# Altium schematic symbol library LimeMicroAltiumLib.SchLib: 584 symbols (part 10 of 13)
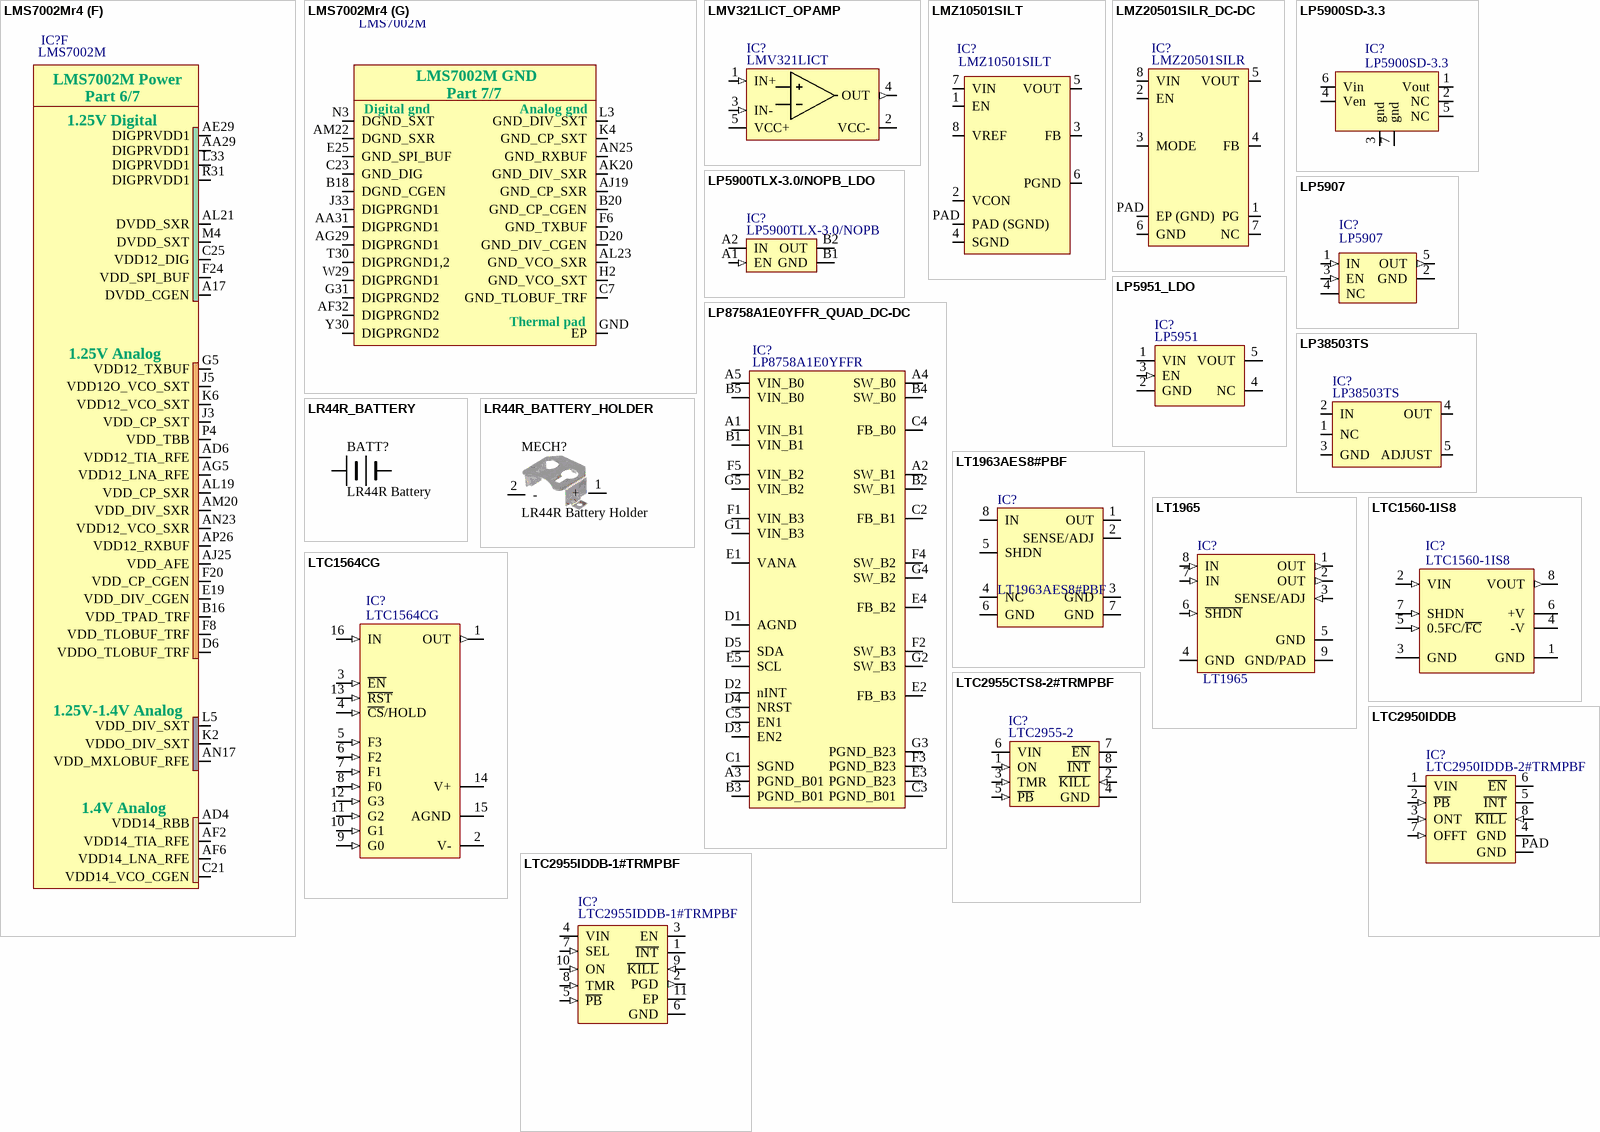
[diagram p83: symbols LMS7002Mr4 to LTC2955IDDB-1#TRMPBF]

## LTC2955IDDB-1#TRMPBF
designator IC?
Pushbutton On / Off Controller with Automatic Turn-On, 10-pin SON (DDB10), -40 to 85 degC, Pb-Free, Mini Tape and Reel; Part Description: IC CTLR ON/OFF PUSHBUTTON 10-DFN; Manufacturer: Analog Devices / Linear Technology; Min Supply Voltage: 1.6V; Max Supply Voltage: 36V; Operating Supply Current: 1.2uA; Threshold Voltage: 800mV; ComponentLink3Description: Package Specification; ComponentLink3URL: http://cds.linear.com/docs/en/packaging/DFN_10_05-08-1722.pdf; ComponentLink2URL: http://cds.linear.com/docs/en/datasheet/2955f.pdf; ComponentLink2Description: Datasheet; ComponentLink1Description: Manufacturer URL; ComponentLink1URL: http://www.linear.com/; Supplier 1: Digi-Key; Supplier Part Number 1: LTC2955IDDB-1#TRMPBFCT-ND; Manufacturer Part Number 1: LTC2955IDDB-1#TRMPBF; Stock 1: 8955; Pricing 1: 1=6,06000, 25=3,44000, 100=3,07230 (USD); RoHS: Yes; Case/Package: DFN; Number of Pins: 10; Min Operating Temperature: -40°C; Max Operating Temperature: 85°C; Package Quantity: 500; Packaging: Tape and Reel; Nominal Supply Current: 1.2uA; Length: 3mm; REACH SVHC: No SVHC; Lead Free: Lead Free; ComponentLink4URL: https://datasheet.ciiva.com/1169/1563221-1169346.pdf?src-supplier=Element14; ComponentLink4Description: https://datasheet.ciiva.com/1169/1563221-1169346.pdf?src-supplier=Element14; ComponentLink5URL: https://datasheet.ciiva.com/1176/1563221-1176339.pdf?src-supplier=Newark; ComponentLink5Description: https://datasheet.ciiva.com/1176/1563221-1176339.pdf?src-supplier=Newark; ComponentLink6URL: https://datasheet.ciiva.com/22621/1563221-22621578.pdf?src-supplier=Element14; ComponentLink6Description: https://datasheet.ciiva.com/22621/1563221-22621578.pdf?src-supplier=Element14; ComponentLink7URL: https://datasheet.ciiva.com/1967/41161-1967533.pdf?src-supplier=Digi-Key; ComponentLink7Description: https://datasheet.ciiva.com/1967/41161-1967533.pdf?src-supplier=Digi-Key; ComponentLink8URL: https://datasheet.ciiva.com/1173/1563221-1173151.pdf?src-supplier=Farnell; ComponentLink8Description: https://datasheet.ciiva.com/1173/1563221-1173151.pdf?src-supplier=Farnell; ComponentLink9URL: https://datasheet.ciiva.com/1967/41161-1967535.pdf?src-supplier=Digi-Key; ComponentLink9Description: https://datasheet.ciiva.com/1967/41161-1967535.pdf?src-supplier=Digi-Key; ComponentLink10URL: https://datasheet.ciiva.com/48695/001256199-da-01-en-ic-ctlr-ltc2955iddb-1-trmpbf-dfn-10-ltc-48695846.pdf?src-supplier=Conrad; ComponentLink10Description: https://datasheet.ciiva.com/48695/001256199-da-01-en-ic-ctlr-ltc2955iddb-1-trmpbf-dfn-10-ltc-48695846.pdf?src-supplier=Conrad
footprint LTC2955IDDB-1#TRMPBF_10-DFN (SON, 10-Leads, Body 3x2mm, Pitch 0.5mm, Thermal Pad 2.39x0.64mm)
pins: 1 ~{INT} (oc) "Open Drain Interrupt Output. Connect this pin to the interrupt input of the system with a pull-up resistor to the system supply. The LTC2955 asserts the I\N\T\ pin low when it receives the turn-off command from the (See Datasheet)", 2 PGD (out) "ON Status Output. A high on this pin indicates that the voltage at the ON pin is above the input threshold of 0.8V. This pin can be used as a system input to inform the system whether the turn-on was triggered by the ON pin (See Datasheet)", 3 EN (oc) "Enable Output (LTC2955-1). EN is an active high output to control the turn-on/off of the system power. Connect this pin to the RUN or S\H\U\T\D\O\W\N\ pin of the voltage regulator. The LTC2955 asserts EN high when the (See Datasheet)", 4 VIN (power) "Power Supply Input. For > 20V applications, connect VIN to the power source through a 1k resistor and bypass VIN to GND with a 10nF low ESR capacitor.", 5 ~{PB} (in) "Pushbutton Input. This is an active low input with a 900k pull-up to an internal LDO. Connect one terminal of the pushbutton to this pin and connect the other terminal of the pushbutton to GND. The pin may be left open if (See Datasheet)", 6 GND (power) "Device Ground.", 7 SEL (in) "Mode Select Input. Connect SEL to GND to block the ON pin falling edge from activating system turn-off. Connect SEL to VIN to allow both the ON pin rising and falling edges to activate system turn-on and turn-off (See Datasheet)", 8 TMR (in) "Timer Pin. A capacitor to ground determines the additional time (5.2 seconds/uF) beyond the default 64ms that the pushbutton must be held low before immediately releasing the EN/E\N\ and I\N\T\ outputs. The turn-off debounce (See Datasheet)", 9 ~{KILL} (in) "Kill Input. A low at K\I\L\L\ releases the enable output (EN/E\N\). This pin can be driven by the microprocessor or it can be used as a voltage monitor input. Tie to the system power supply or an external voltage of 1.2V~5V (See Datasheet)", 10 ON (in) "Monitor Input. Connect this pin to an external resistive divider from the monitored voltage. This allows automatic system turn-on when the monitored voltage transitions high. For the DFN part, if the SEL pin is tied high, it (See Datasheet)", 11 EP (power) "Exposed pad. Leave open or connect to device ground."

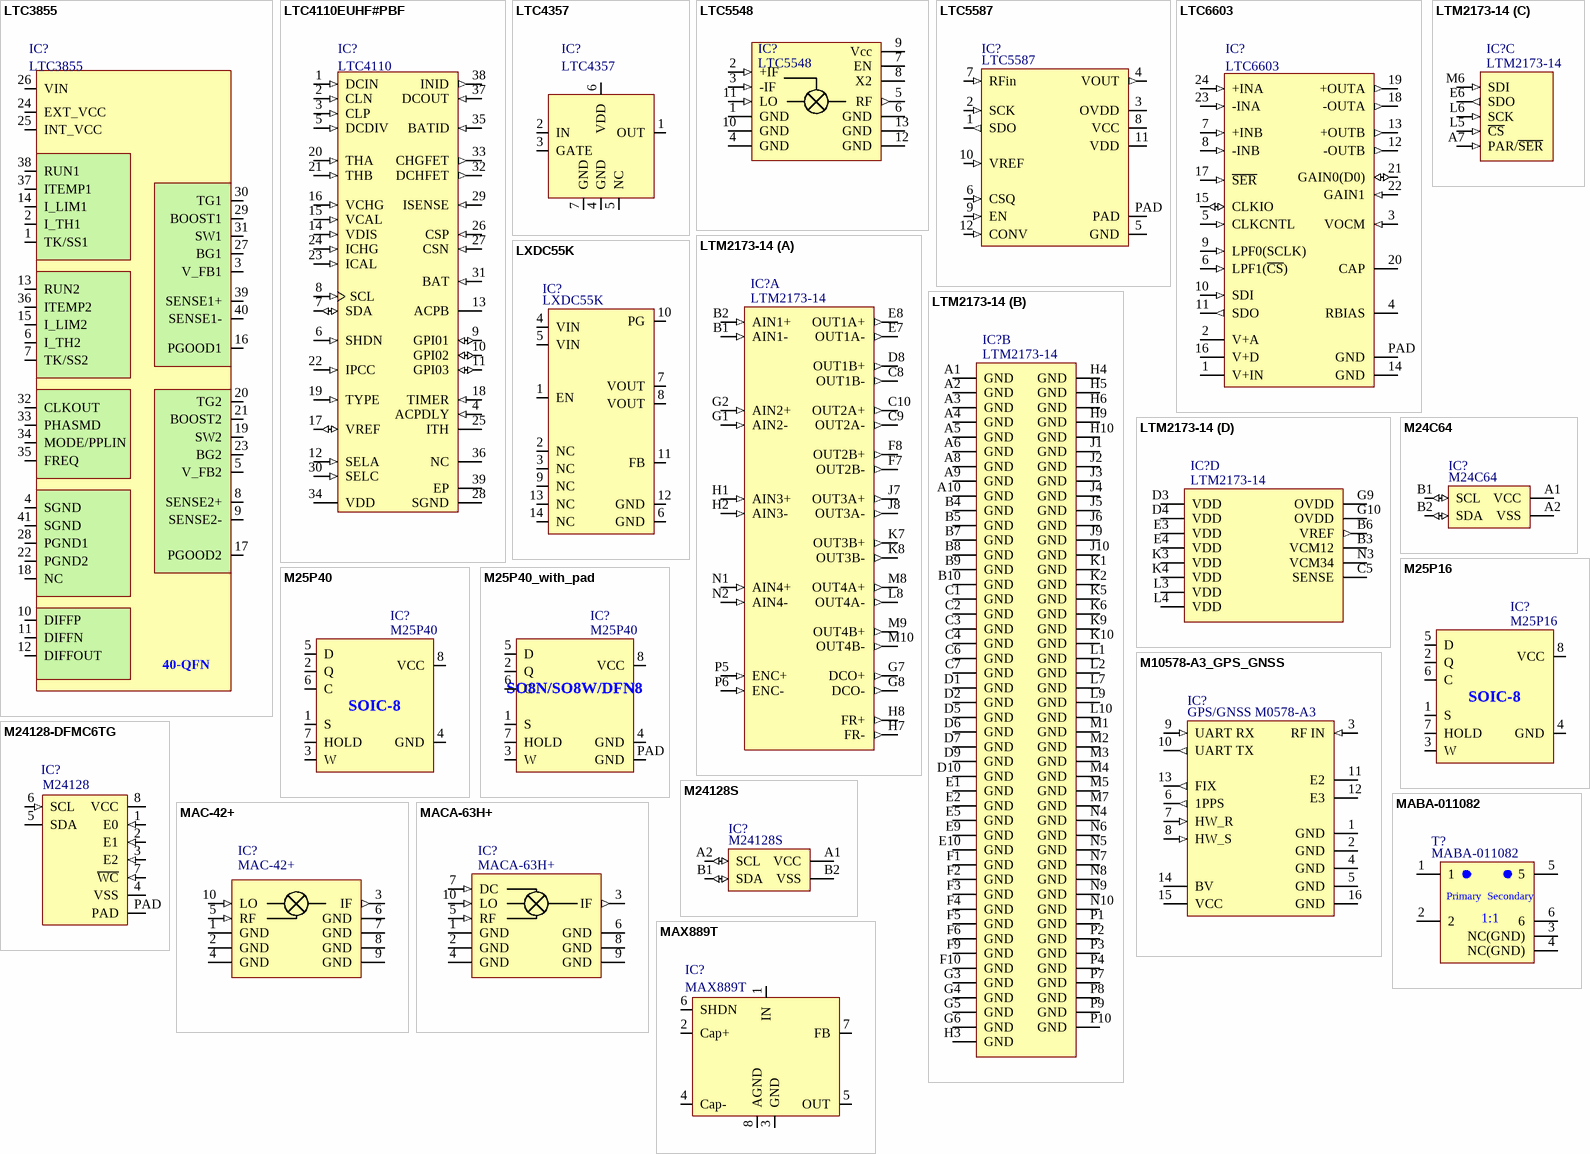
[diagram p57: symbols LTC3855 to MAX889T]

## LTC3855
designator IC?
Manufacturer: Linear Technology; Number of Outputs: 2; Frequency - Max: 850kHz; Voltage - Supply: 4.5 V ~ 38 V; Duty Cycle: 95%; Supplier 1: Digi-Key; Package / Case: 40-WFQFN Exposed Pad; Operating Temperature: -40°C ~ 85°C; Category: Integrated Circuits (ICs); Supplier Part Number 1: LTC3855EUJ#TRPBF-ND
footprint LTC3855 (QFN, 40-Leads, Body 6,00x6,00mm, Pitch 0,50mm, Thermal Pad 4,40x4,40mm, IPC Medium Density)
pins: 1 TK/SS1, 2 I_TH1, 3 V_FB1, 4 SGND, 5 V_FB2, 6 I_TH2, 7 TK/SS2, 8 SENSE2+, 9 SENSE2-, 10 DIFFP, 11 DIFFN, 12 DIFFOUT, 13 RUN2, 14 I_LIM1, 15 I_LIM2, 16 PGOOD1, 17 PGOOD2, 18 NC, 19 SW2, 20 TG2, 21 BOOST2, 22 PGND2, 23 BG2, 24 EXT_VCC, 25 INT_VCC, 26 VIN, 27 BG1, 28 PGND1, 29 BOOST1, 30 TG1, 31 SW1, 32 CLKOUT, 33 PHASMD, 34 MODE/PPLIN, 35 FREQ, 36 ITEMP2, 37 ITEMP1, 38 RUN1, 39 SENSE1+, 40 SENSE1-, 41 SGND
text: 40-QFN

## LTC4110EUHF#PBF
designator IC?, comment LTC4110
Battery Backup System Manager, 4.5 to 19 V Vin, 38-pin QFN (UHF-38), -40 to 85 degC, Pb-Free; Part Description: Battery Multi-Function Controller IC Multi-Chemistry 38-QFN (5x7); Manufacturer Part Number 1: LTC4110EUHF#PBF; Manufacturer: Linear Technology/Analog Devices; Supplier 1: Digi-Key; Supplier Part Number 1: LTC4110EUHF#PBF-ND
footprint LTC4110EUHF#PBF_QFN38 (QFN, 38-Leads, Body 7.1x5.1mm, Pitch 0.5mm, Thermal Pad 3.15x5.15mm, IPC Low Density)
pins: 1 DCIN (in) "External DC Power Sense Input. Provides a control input and supply for the main supply ideal diode function.", 2 CLN (in) "Current Limit Sense Negative Input. See CLP pin.", 3 CLP (in) "Current Limit Sense Positive Input. This pin and the CLN pin form a differential input that senses voltage on an external resistor for reverse current entering the power source while in low loss calibration mode. Should the (See Datasheet)", 4 ACPDLY (in) "ACPb Delay Control Pin. A capacitor connected from ACPDLY to GND and a resistor from VREF to GND programs delay in the ACPb pin high-to-low transition. Open if minimum delay is desired.", 5 DCDIV (in) "AC Present Detection Input. Backup operation is invoked when the system power voltage, divided by an external resistor divider, falls below the threshold of this pin.", 6 SHDN (in) "Active High Shutdown/Reset Control Logic Input. Forces micropower shutdown mode if high when DCIN supply is removed. Forces all registers to reset if high when DCIN supply is present. Normally tied to ground. Internal pin (See Datasheet)", 7 SDA (io) "SMBus Bidirectional Data Signal. Connect to VDD when not in use.", 8 SCL (in) "SMBus Clock Signal Input From SMBus Host. Connect to VDD when not in use.", 9 GPI01 (io) "General Purpose I/O or Charge Status Pin. A logic-level I/O bit port that is configurable as a host-driven input/output port or as a battery charge status output (CHGb) with an open-drain N-MOSFET that is asserted low when (See Datasheet)", 10 GPI02 (io) "General Purpose I/O Pin. A logic-level I/O bit port that is configurable as a host-driven input/output port or as a battery undervoltage status output (BKUP_FLTb) with an open-drain N-MOSFET that is asserted low only while (See Datasheet)", 11 GPI03 (io) "General Purpose I/O Pin. A logic-level I/O bit port that is configurable as a host-driven input/output port or as a calibration complete status output (CAL_COMPLETEb) with an open-drain N-MOSFET that is asserted low when (See Datasheet)", 12 SELA (in) "SMBus Address Selection Input. Selects the LTC4110 SMBus address to facilitate redundant backup systems when standard batteries are used. Connect to GND for 12h, VDD for 28h and the VREF pin for 20h. When a smart battery is (See Datasheet)", 13 ACPB (oc) "AC Present Status Digital Output. Open-Drain N-MOSFET output is asserted low when the main supply is present as detected by the DCDIV pin and internal DCIN UVLO.", 14 VDIS (in) "Battery Discharge Voltage Limit During Backup Program Input. Battery threshold voltage at which backup mode will terminate by turning off the isolation P-MOSFET with the BATID pin. Adjustable from external resistor string (See Datasheet)", 15 VCAL (in) "Battery Voltage Limit During Calibration Program Input. Battery threshold voltage at which calibration will terminate. Adjustable from external resistor string biased from VREF pin. For default threshold connect to GND pin.", 16 VCHG (in) "Battery Float Voltage Program Input. Trims the float voltage during charging. Programmed from external resistor string biased from VREF pin. Connect to GND for default float voltage.", 17 VREF (io) "Voltage Reference Output and Timing Programming Input. Provides a typical virtual reference of 1.220V (VREF) for an external resistor divider tied between this pin and GND that programs the VCHG, VCAL and VDIS pin functions. (See Datasheet)", 18 TIMER (in) "Charge Timing Input. A capacitor connected between TIMER and GND along with the resistance connected from VREF to GND programs the charge time intervals.", 19 TYPE (in) "Refer to Table 8.", 20 THA (in) "Safety Signal Force/Sense Pin to Smart Battery and Force Pin to Lead Acid Battery Thermistor. See description of operation for more detail. The maximum allowed combined capacitance on THA, THB and Safety Signal is 1nF. For (See Datasheet)", 21 THB (in) "Safety Signal Force/Sense Pin to Smart Battery and Sense Pin to Lead Acid Battery Thermistor. See description of operation for more detail. The maximum allowed combined capacitance on THA, THB and Safety Signal is 1nF.", 22 IPCC (in) "Battery Preconditioning Charge Current Program Input. Programs the battery current during preconditioning or wakeup charging. Programmed from external resistor to GND.", 23 ICAL (in) "Battery Discharge Current During Calibration Program Input. Programs the constant discharge current at the battery during calibration. Programmed from external resistor to GND.", 24 ICHG (in) "Battery Current During Charge Program Input. Programs the battery current while constant-current bulk charging. Programmed from external resistor to GND.", 25 ITH "Control Signal of the Current Mode PWM. AC compensates control loop. Higher ITH voltage corresponds to higher charging current.", 26 CSP (in) "Current Sense Positive Input. This pin and the CSN pin measure voltage across the external current sense resistor to control battery current during charging and calibration.", 27 CSN (in) "Current Sense Negative Input. This pin and the CSP pin measure voltage across the external current sense resistor to control battery current during charging and calibration.", 28 SGND (power) "Signal Ground Reference Input. This pin should be Kelvin connected to the flyback current sense resistor and to the battery return.", 29 ISENSE (in) "Current Sense Input. Senses current in the flyback transformer by monitoring voltage across the external current sense resistor. This pin should be Kelvinconnected to the resistor.", 30 SELC (in) "Refer to Table 8.", 31 BAT (in) "Battery Voltage Sense Input. This pin is used to monitor the battery and control charging voltage through an internal resistor divider connected to this pin that is disconnected in shutdown mode. Also provides a control (See Datasheet)", 32 DCHFET (out) "Drives the Gate of an External N-MOSFET. Used to drive energy into the battery side of the high efficiency switch mode converter during low loss calibration discharge of the battery. Provides synchronous rectification during (See Datasheet)", 33 CHGFET (out) "Drives the Gate of an External N-MOSFET. Used to drive energy into the supply side of the high efficiency switch mode converter during battery charging. Provides synchronous rectification during low loss calibration mode.", 34 VDD (power) "Bypass Capacitor Connection for Internal VDD Regulator. Bypass at pin with 100nF low ESR capacitor to GND.", 35 BATID (in) "Drives the Gate of the Battery P-MOSFET Ideal Diode. Controls low loss ideal diode between the battery and backup load when in backup mode. When not in backup mode, the P-MOSFET is turned off to prevent battery power from (See Datasheet)", 36 NC "No Connect.", 37 DCOUT (in) "System Power Output Voltage Monitor Input. Provides a control input for supply input ideal diode and battery ideal diode functions. Also supplies power to the IC. Bypass at pin with 100nF low ESR capacitor to GND.", 38 INID (out) "Drives the Gate of the Supply Input P-MOSFET Ideal Diode. Controls low loss ideal diode between the supply input and backup load when not in backup mode.", 39 EP (power) "Ground. The Exposed Pad must be soldered to the PCB."

## LTC4357
designator IC?
Manufacturer Part Number: LTC4357IDCB#TRMPBF; Current - Supply: 500µA; Delay Time - OFF: 300ns; Voltage - Supply: 9 V ~ 80 V; FET Type: N-Channel; Supplier 1: Digi-Key; Type: N+1 ORing Controller; Category: Integrated Circuits (ICs); Applications: Automotive, Redundant Power Supplies, Telecom Infrastructure; Operating Temperature: -40°C ~ 85°C; Supplier Device Package: 6-DFN (2x3); Supplier Part Number: LTC4357IDCB#TRMPBFDKR-ND
footprint LTC4357 (SON, 6-Leads, Body 2,00x3,00mm, Pitch 0,50mm, Thermal Pad 1,35x1,12mm, IPC Medium Density)
pins: 1 OUT, 2 IN, 3 GATE, 4 GND, 5 NC, 6 VDD, 7 GND

## LTC5548
designator IC?
Frequency Mixer 2 GHz to 12 GHz; Manufacturer: Analog Devices / Linear Technology; Manufacturer Part Number: LTC5548IUDB#TRMPBF; Frequency: 14GHz; Noise Figure: 9.6dB; Operating Supply Current: 136mA; Min Supply Voltage: 3V; Max Supply Voltage: 3.6V; Supplier 1: Digi-Key; Stock 1: 1418; Pricing 1: 1=19.06, 25=15.2464, 100=12.425, 250=12.14472 (USD); Case/Package: QFN; Number of Pins: 12; Min Operating Temperature: -40°C; Max Operating Temperature: 105°C; Packaging: Tape and Reel; Max Frequency: 14GHz; REACH SVHC: No SVHC; Supplier Part Number 1: LTC5548IUDB#TRMPBFCT-ND
footprint LTC5548_FROM_ULTRA_LABRARIAN
pins: 1 GND, 2 +IF (in), 3 -IF (in), 4 GND, 5 RF (out), 6 GND, 7 EN, 8 X2, 9 Vcc, 10 GND, 11 LO (in), 12 GND, 13 GND

## LTC5587
designator IC?
Manufacturer: Linear Technology/Analog Devices; Manufacturer Part Number: LTC5587IDD#TRPBF; Part Description: RF Detector IC CDMA, GSM, EDGE, W-CDMA 10MHz ~ 6GHz -34dBm ~ 6dBm ±1dB 12-WFDFN Exposed Pad; Frequency: 10MHz ~ 6GHz; RF Type: CDMA, GSM, EDGE, W-CDMA; Input Range: -34dBm ~ 6dBm; Accuracy: ±1dB; Voltage - Supply: 2.7 V ~ 3.6 V; Supplier 1: Digi-Key; RoHS: RoHS Compliant; Category: RF/IF and RFID; Stock 1: 0; Pricing 1: 2500=6.49745 (USD); Packaging: Tape & Reel (TR); Part Status: Active; Package / Case: 12-WFDFN Exposed Pad; Supplier Device Package: 12-DFN (3x3); ComponentLink1URL: http://www.linear.com/docs/29700; ComponentLink1Description: http://www.linear.com/docs/29700; Supplier Part Number 1: LTC5587IDD#TRPBFTR-ND
footprint LTC5587_DFN12
pins: 1 SDO (out), 2 SCK (in), 3 OVDD (power), 4 VOUT (out), 5 GND, 6 CSQ (in), 7 RFin (in), 8 VCC (power), 9 EN (in), 10 VREF (in), 11 VDD (power), 12 CONV (in), PAD

## LTC6603
designator IC?
Part Description: Low Pass Filter IC Low Pass 9th Order 2.5MHz 24-QFN (4x4); Manufacturer: Analog Devices / Linear Technology; Manufacturer Part Number 1: LTC6603IUF#PBF; Nominal Gain Bandwidth Product: 2.5MHz; Max Supply Voltage: 3.6V; Min Supply Voltage: 2.7V; Operating Supply Voltage: 3V; Number of Circuits: 2; Input Offset Voltage (Vos): 8mV; Supplier 1: Mouser; Supplier Part Number 1: 584-LTC6603IUF#PBF; Stock 1: 219; Pricing 1: 1=16,66000, 25=13,32000, 100=10,86000, 250=10,61000, 500=10,20000 (USD); RoHS: Yes; Case/Package: QFN; Number of Pins: 24; Min Operating Temperature: -40°C; Max Operating Temperature: 85°C; Package Quantity: 91; Type: Active; Packaging: Rail/Tube; Number of Channels: 2; Radiation Hardening: No; Lead Free: Lead Free; ComponentLink1URL: https://datasheet.ciiva.com/1779/26885-1779299.pdf?src-supplier=Digi-Key; ComponentLink1Description: https://datasheet.ciiva.com/1779/26885-1779299.pdf?src-supplier=Digi-Key; ComponentLink2URL: https://datasheet.ciiva.com/1150/1712310-1150994.pdf?src-supplier=Element14; ComponentLink2Description: https://datasheet.ciiva.com/1150/1712310-1150994.pdf?src-supplier=Element14; ComponentLink3URL: https://datasheet.ciiva.com/1153/1712310-1153853.pdf?src-supplier=Farnell; ComponentLink3Description: https://datasheet.ciiva.com/1153/1712310-1153853.pdf?src-supplier=Farnell
footprint LTC6603_QFN24
pins: 1 V+IN (power) "Input Voltage Supply (2.7V =< V =< 5.5V). This supply must be kept free from noise and ripple. It should be bypassed directly to a ground plane with a 0.1uF capacitor unless it is tied to V+A (Pin 2). The bypass should be as (See Datasheet)", 2 V+A (power) "Analog Voltage Supply (2.7V =< V =< 3.6V). This supply must be kept free from noise and ripple. It should be bypassed directly to a ground plane with a 0.1uF capacitor. The bypass should be as close as possible to the IC.", 3 VOCM (in) "Output common mode voltage reference. If floated, an internal resistive divider sets the voltage on this pin to half the supply voltage (typically 1.5V), maximizing the dynamic range of the filter. If this pin is floated, it (See Datasheet)", 4 RBIAS "Oscillator Frequency-Setting Resistor Input. The value of the resistor connected between this pin and ground determines the frequency of the master oscillator, and sets the bias currents for the fi lter networks. The voltage (See Datasheet)", 5 CLKCNTL (in) "Clock Control Input. This three-state input selects the function of CLKIO (Pin 15). Tying the CLKCNTL pin to ground allows the CLKIO pin to be driven by an external clock (CLKIO is the master clock input).", 6 LPF1(~{CS}) (in) "TTL Level Input. When in pin programmable control mode, this pin is the MSB of the lowpass cutoff frequency control code; in serial control mode, this pin is the chip select input (active low).", 7 +INB (in) "Channel B Differential Inputs. The input range and input resistance are described in the Applications Information section. Input voltages which exceed V+IN (Pin 1) should be avoided.", 8 -INB (in) "Channel B Differential Inputs. The input range and input resistance are described in the Applications Information section. Input voltages which exceed V+IN (Pin 1) should be avoided.", 9 LPF0(SCLK) (in) "TTL Level Input. When in pin programmable control mode, this pin is the LSB of the lowpass cutoff frequency control code; in serial control mode, this pin is the clock of the serial interface.", 10 SDI (in) "TTL Level Input. When in pin programmable control mode, this pin is left floating; in serial control mode, this pin is the serial data input.", 11 SDO (out) "TTL Level Input. When in pin programmable control mode, this pin is left floating; in serial control mode, this pin is the serial data output.", 12 -OUTB (out) "Channel B differential filter outputs. These pins can drive 1k and/or 50pF loads. For larger capacitive loads, an external 100ohm series resistor is recommended for each output. The common mode voltage of the filter outputs (See Datasheet)", 13 +OUTB (out) "Channel B differential filter outputs. These pins can drive 1k and/or 50pF loads. For larger capacitive loads, an external 100ohm series resistor is recommended for each output. The common mode voltage of the filter outputs (See Datasheet)", 14 GND (power) "Ground. Connect to a ground plane for best performance.", 15 CLKIO (io) "When CLKCNTL (Pin 5) is tied to ground, CLKIO is the master clock input. When CLKCNTL is floated, CLKIO is pulled to ground by a weak pulldown. When CLKCNTL is tied to V+D (Pin 16), CLKIO is the master clock output. When (See Datasheet)", 16 V+D (power) "Digital Voltage Supply (2.7V =< V =< 3.6V). This supply must be kept free from noise and ripple. It should be bypassed directly to a ground plane with a 0.1uF capacitor. The bypass should be as close as possible to the IC.", 17 ~{SER} (in) "Interface Selection Input. When tied to V+D (Pin 16) or floated, the interface is in pin programmable control mode, i.e. the filter gain and cutoff frequencies are programmed by the GAIN1, GAIN0, LPF1 and LPF0 pins. When (See Datasheet)", 18 -OUTA (out) "Channel A differential filter outputs. These pins can drive 1k and/or 50pF loads. For larger capacitive loads, an external 100ohm series resistor is recommended for each output. The common mode voltage of the filter outputs (See Datasheet)", 19 +OUTA (out) "Channel A differential filter outputs. These pins can drive 1k and/or 50pF loads. For larger capacitive loads, an external 100ohm series resistor is recommended for each output. The common mode voltage of the filter outputs (See Datasheet)", 20 CAP "Connect a 0.1uF bypass capacitor to this pin. Pin 20 is a buffered version of Pin 3.", 21 GAIN0(D0) (io) "TTL Level Input. When in pin programmable control mode, this pin is the LSB of the gain control code; in serial control mode, this pin is the LSB of the serial control register, an output.", 22 GAIN1 (in) "TTL Level Input. When in pin programmable control mode, this pin is the MSB of the gain control code; in serial control mode, this pin is a no-connect.", 23 -INA (in) "Channel A Differential Inputs. The input range and input resistance are described in the Applications Information section. Input voltages which exceed V+IN (Pin 1) should be avoided.", 24 +INA (in) "Channel A Differential Inputs. The input range and input resistance are described in the Applications Information section. Input voltages which exceed V+IN (Pin 1) should be avoided.", PAD GND (power) "Ground. The Exposed Pad must be soldered to PCB."

## LTM2173-14
designator IC?
Analog to Digital Converters - ADC 14-bit, 80Msps, 1.8V Low Noise Quad ADC, Serial LVDS Outputs; Manufacturer: Analog Devices; Manufacturer Part Number 1: LTC2271IUKG#PBF; Supplier Part Number 1: 584-LTC2271IUKG#PBF; Part Description: Analog to Digital Converters - ADC 14-bit, 80Msps, 1.8V Low Noise Quad ADC, Serial LVDS Outputs; Supplier 1: Mouser
footprint LTM2173_14_BGA9x11.25_140
part A pins: B1 AIN1- (in), B2 AIN1+ (in), C8 OUT1B- (out), C9 OUT2A- (out), C10 OUT2A+ (out), D8 OUT1B+ (out), E7 OUT1A- (out), E8 OUT1A+ (out), F7 OUT2B- (out), F8 OUT2B+ (out), G1 AIN2- (in), G2 AIN2+ (in), G7 DCO+ (out), G8 DCO- (out), H1 AIN3+ (in), H2 AIN3- (in), H7 FR- (out), H8 FR+ (out), J7 OUT3A+ (out), J8 OUT3A- (out), K7 OUT3B+ (out), K8 OUT3B- (out), L8 OUT4A- (out), M8 OUT4A+ (out), M9 OUT4B+ (out), M10 OUT4B- (out), N1 AIN4+ (in), N2 AIN4- (in), P5 ENC+ (in), P6 ENC- (in)
part B pins: A1 GND, A2 GND, A3 GND, A4 GND, A5 GND, A6 GND, A8 GND, A9 GND, A10 GND, B4 GND, B5 GND, B7 GND, B8 GND, B9 GND, B10 GND, C1 GND, C2 GND, C3 GND, C4 GND, C6 GND, C7 GND, D1 GND, D2 GND, D5 GND, D6 GND, D7 GND, D9 GND, D10 GND, E1 GND, E2 GND, E5 GND, E9 GND, E10 GND, F1 GND, F2 GND, F3 GND, F4 GND, F5 GND, F6 GND, F9 GND, F10 GND, G3 GND, G4 GND, G5 GND, G6 GND, H3 GND, H4 GND, H5 GND, H6 GND, H9 GND, H10 GND, J1 GND, J2 GND, J3 GND, J4 GND, J5 GND, J6 GND, J9 GND, J10 GND, K1 GND, K2 GND, K5 GND, K6 GND, K9 GND, K10 GND, L1 GND, L2 GND, L7 GND, L9 GND, L10 GND, M1 GND, M2 GND, M3 GND, M4 GND, M5 GND, M7 GND, N4 GND, N5 GND, N6 GND, N7 GND, N8 GND, N9 GND, N10 GND, P1 GND, P2 GND, P3 GND, P4 GND, P7 GND, P8 GND, P9 GND, P10 GND
part C pins: A7 PAR/~{SER} (in), E6 SDO (out), L5 ~{CS} (in), L6 SCK (in), M6 SDI (in)
part D pins: B3 VCM12 (power), B6 VREF (out), C5 SENSE (power), D3 VDD (power), D4 VDD (power), E3 VDD (power), E4 VDD (power), G9 OVDD (power), G10 OVDD (power), K3 VDD (power), K4 VDD (power), L3 VDD (power), L4 VDD (power), N3 VCM34 (power)

## LXDC55K
designator IC?
LXDC55KAAA-205; Manufacturer: Murata Electronics North America; Power (Watts) - Manufacture Series: 11W; Current - Output (Max): 3A; Efficiency: 93%; Voltage - Input (Min): 2.7V; Voltage - Input (Max): 5.5V; Voltage - Output 1: 0.8 ~ 3.6 V; Number of Outputs: 1; Supplier 1: Digi-Key; Manufacturer Part Number 1: LXDC55KAAA-205; Category: Power Supplies - Board Mount; Type: Non-Isolated PoL Module; Package / Case: 14-SMD Module; Voltage - Output 3: -; Mounting Type: Surface Mount; Applications: ITE (Commercial); RoHS: RoHS Compliant; Power (Watts) - Max: 11W; Voltage - Output 2: -; Features: OCP, OTP, UVLO; Operating Temperature: -40°C ~ 85°C; Packaging: Digi-Reel®; Voltage - Isolation: -; Size / Dimension: 0.224" L x 0.224" W x 0.079" H (5.70mm x 5.70mm x 2.00mm); Supplier Part Number 1: 490-7312-6-ND
footprint LXDC55K
pins: 1 EN, 2 NC, 3 NC, 4 VIN, 5 VIN, 6 GND, 7 VOUT, 8 VOUT, 9 NC, 10 PG, 11 FB, 12 GND, 13 NC, 14 NC

## M24C64
designator IC?
Manufacturer Part Number 1: M24C64-FCU6TP/TF; Access Time: 450 ns; Organization: 8 k x 8; Brand: STMicroelectronics; Supply Current - Max: 1.5 mA, 2.5 mA; Interface Type: I2C; Memory Size: 64 kbit; Maximum Clock Frequency: 1 MHz; Data Retention: 200 Years; Supply Voltage - Max: 5.5 V; Operating Supply Voltage: 1.6 V to 5.5 V; Supply Voltage - Min: 1.6 V; Product Status: New Product; Supplier 1: Mouser; Manufacturer: STMicroelectronics; Series: Standard Serial EEPROM; Category: EEPROM; Mounting Style: SMD/SMT; RoHS: RoHS Compliant; Package / Case: WLCSP-4; Operating Supply Current: 1.5 mA, 2.5 mA; Maximum Operating Temperature: + 85 C; Minimum Operating Temperature: - 40 C; RoHS - Mouser: Y; Minimum Order Quantity: 1; Reeling: False; Supplier Part Number 1: 511-M24C64-FCU6TP/TF
footprint M24C64
pins: A1 VCC, A2 VSS, B1 SCL (io), B2 SDA (io)

## M25P16
designator IC?
Manufacturer: Micron Technology Inc; Voltage - Supply: 2.7 V ~ 3.6 V; Memory Size: 16M (2M x 8); Speed: 75MHz; Supplier 1: Digi-Key; Supplier: Digi-Key; Supplier Device Package: 8-SO W; Supplier Part Number: M25P16-VMW6TGCT-ND
footprint M25P16_SO8 (SOIC, 8-Leads, Body 4,90x3,90mm, Pitch 1,27mm, IPC Medium Density)
pins: 1 S, 2 Q, 3 W, 4 GND, 5 D, 6 C, 7 HOLD, 8 VCC
text: SOIC-8

## M25P40
designator IC?
Manufacturer: Micron Technology Inc; Memory Size: 4M (512K x 8); Voltage - Supply: 2.3 V ~ 3.6 V; Supplier 1: Digi-Key; Supplier Device Package: 8-SO; Supplier: Digi-Key; Supplier Part Number: M25P40-VMN6TPBTR-ND
footprint M25P40-VMN6TPB_SO8N (SOIC, 8-Leads, Body 4,90x3,90mm, Pitch 1,27mm, IPC Medium Density)
pins: 1 S, 2 Q, 3 W, 4 GND, 5 D, 6 C, 7 HOLD, 8 VCC
text: SOIC-8

## M25P40_with_pad
designator IC?, comment M25P40
Manufacturer: Micron Technology Inc; Memory Size: 4M (512K x 8); Voltage - Supply: 2.3 V ~ 3.6 V; Supplier 1: Digi-Key; Supplier Device Package: 8-SO; Supplier: Digi-Key; Supplier Part Number: M25P40-VMN6TPBTR-ND
footprint S25FL164K_WSON8_DFN6 (WSON8 and DFN8 6x5mm compatible footprint)
pins: 1 S, 2 Q, 3 W, 4 GND, 5 D, 6 C, 7 HOLD, 8 VCC, PAD GND
text: SO8N/SO8W/DFN8

## M10578-A3_GPS_GNSS
designator IC?, comment GPS/GNSS M0578-A3
Manufacturer: Antenova; Manufacturer Part Number 1: M10578-A3; Part Description: RADIONOVA RF Receiver GPS 1.575GHz -165dBm Module; Frequency: 1.575GHz; Sensitivity: -165dBm; Modulation or Protocol: GPS; Current - Receiving: 28mA; Data Interface: UART; Voltage - Supply: 3.3V; Supplier 1: Digi-Key; RoHS: RoHS Compliant; Category: RF/IF and RFID; Stock 1: 0; Pricing 1: 1=17.75, 10=16.061, 25=14.7928, 100=13.5248, 250=12.67952, 500=11.8342 (USD); Packaging: Cut Tape (CT); Part Status: Active; Data Rate (Max): -; Applications: General Purpose; Memory Size: -; Antenna Connector: -; Features: -; Operating Temperature: -40°C ~ 85°C; Package / Case: Module; Supplier Device Package: Module; ComponentLink1URL: http://www.antenova-m2m.com/wp-content/uploads/2015/12/GPS_Radionova_M10578-A3-PS-1.0.pdf; ComponentLink1Description: http://www.antenova-m2m.com/wp-content/uploads/2015/12/GPS_Radionova_M10578-A3-PS-1.0.pdf; Supplier Part Number 1: 627-1074-1-ND
footprint M10578-A3 (RADIONOVA® RF Receiver GPS 1.575GHz -165dBm Module)
pins: 1 GND, 2 GND, 3 RF IN (in), 4 GND, 5 GND, 6 1PPS (out), 7 HW_R (in), 8 HW_S (in), 9 UART RX (in), 10 UART TX (out), 11 E2, 12 E3, 13 FIX (out), 14 BV (power), 15 VCC (power), 16 GND

## M24128-DFMC6TG
designator IC?, comment M24128
Manufacturer: STMicroelectronics; Manufacturer Part Number 1: M24128-DFMC6TG; Part Description: EEPROM Memory IC 128Kb (16K x 8) I²C 1MHz 450ns 8-UFDFPN (2x3); Memory Type: Non-Volatile; Memory Format: EEPROM; Memory Size: 128Kb (16K x 8); Write Cycle Time - Word, Page: 5ms; Memory Interface: I²C; Voltage - Supply: 1.7 V ~ 5.5 V; Supplier 1: Digi-Key; RoHS: RoHS Compliant; Category: Integrated Circuits (ICs); Stock 1: 5894; Pricing 1: 1=0.35, 10=0.348, 100=0.2854, 500=0.27748, 1000=0.27004 (USD); Packaging: Cut Tape (CT); Part Status: Active; Technology: EEPROM; Operating Temperature: -40°C ~ 85°C (TA); Mounting Type: Surface Mount; Package / Case: 8-UFDFN Exposed Pad; Supplier Device Package: 8-UFDFPN (2x3); ComponentLink1URL: http://www.st.com/content/ccc/resource/technical/document/datasheet/59/05/c9/5b/7b/41/48/b6/CD00259167.pdf/files/CD00259167.pdf/jcr:content/translations/en.CD00259167.pdf; ComponentLink1Description: http://www.st.com/content/ccc/resource/technical/document/datasheet/59/05/c9/5b/7b/41/48/b6/CD00259167.pdf/files/CD00259167.pdf/jcr:content/translations/en.CD00259167.pdf; Supplier Part Number 1: 497-15739-1-ND
footprint M24128-DFMC6TG (8-UFDFPN (2x3))
pins: 1 E0 (in), 2 E1 (in), 3 E2 (in), 4 VSS (power), 5 SDA (io), 6 SCL (in), 7 ~{WC} (in), 8 VCC (power), PAD (power)

## M24128S
designator IC?
Manufacturer: STMicroelectronics; Manufacturer Part Number 1: M24128S-FCU6T/T; Part Description: IC EEPROM 128KBIT 400KHZ 4WLCSP; Organization: 16 k x 8; Format - Memory: EEPROMs - Serial; Memory Type: EEPROM; Memory Size: 128K (16K x 8); Speed: 400kHz; Interface: I²C, 2-Wire Serial; Voltage - Supply: 1.7 V ~ 5.5 V; Supplier 1: Digi-Key; RoHS: RoHS Compliant; Category: Integrated Circuits (ICs); Stock 1: 1555; Pricing 1: 1=0.48, 10=0.473, 100=0.3883, 500=0.37752, 1000=0.3674 (USD); Packaging: Cut Tape (CT); Part Status: Active; Operating Temperature: -40°C ~ 85°C (TA); Package / Case: 4-XFBGA, WLCSP; Supplier Device Package: 4-WLCSP; ComponentLink1URL: http://www.st.com/content/ccc/resource/technical/document/datasheet/54/55/87/98/35/27/49/88/DM00103408.pdf/files/DM00103408.pdf/jcr:content/translations/en.DM00103408.pdf; ComponentLink1Description: http://www.st.com/content/ccc/resource/technical/document/datasheet/54/55/87/98/35/27/49/88/DM00103408.pdf/files/DM00103408.pdf/jcr:content/translations/en.DM00103408.pdf; Supplier Part Number 1: 497-15026-1-ND
footprint M24128S
pins: A1 VCC, A2 SCL (io), B1 SDA (io), B2 VSS

## MABA-011082
designator T?
Part Description: RF Balun 5MHz ~ 8GHz 1:1 6-SMD Module; Manufacturer: TE Connectivity MA-COM; Supplier 1: Mouser; Supplier Part Number 1: 937-MABA-011082; Manufacturer Part Number 1: MABA-011082; Stock 1: 0; Pricing 1: 1=7,49000, 10=6,78000, 50=6,46000, 100=5,61000, 1000=4,73000, 10000=4,56000 (USD); RoHS: Yes; RoHS Compliant: No
footprint MABA-011082_balun
pins: 1, 2, 3 NC(GND), 4 NC(GND), 5, 6
text: Primary; Secondary; 1:1

## MAC-42+
designator IC?
Frequency Mixer 300 MHz to 12 GHz     LO Levels 4 to 17 dBm; Manufacturer: Mini-Circuits; Part Description: Frequency Mixer 300 MHz to 12 GHz     LO Levels 4 to 17 dBm; Supplier Part Number 1: MAC-42+; Supplier 1: Mini-Circuits; Manufacturer Part Number 1: MAC-42+
footprint MAC-42+_DZ1650
pins: 1 GND, 2 GND, 3 IF (out), 4 GND, 5 RF (in), 6 GND, 7 GND, 8 GND, 9 GND, 10 LO (in)

## MACA-63H+
designator IC?
Active Mixer: Level 0  (LO Power 0 dBm)   2000 to 6000 MHz; Manufacturer: Mini-Circuits; Supplier Part Number 1: MACA-63H+; Supplier 1: Mini-CIrcuits; Part Description: Active Mixer: Level 0  (LO Power 0 dBm)   2000 to 6000 MHz; Manufacturer Part Number 1: MACA-63H+
footprint MACA-63H+_DZ1034
pins: 1 GND, 2 GND, 3 IF (out), 4 GND, 5 RF (in), 6 GND, 7 DC (in), 8 GND, 9 GND, 10 LO (in)

## MAX889T
designator IC?
Manufacturer Part Number 1: MAX889TESA+; Manufacturer: Maxim Integrated; Synchronous Rectifier: No; Voltage - Input: 2.7 V ~ 5.5 V; Current - Output: 200mA; Number of Outputs: 1; Output Type: Adjustable; Frequency - Switching: 2MHz; Voltage - Output: -2.5 V ~ -5.5 V; Supplier 1: Digi-Key; Packaging: Tube; Category: Integrated Circuits (ICs); Type: Switched Capacitor (Charge Pump), Inverting; Mounting Type: Surface Mount; Supplier Device Package: 8-SOIC N; Package / Case: 8-SOIC (0.154", 3.90mm Width); Operating Temperature: -40°C ~ 85°C; RoHS: RoHS Compliant; Supplier Part Number 1: MAX889TESA+-ND
footprint MAX889T (SOIC, 8-Leads, Body 4,90x3,90mm, Pitch 1,27mm, IPC Medium Density)
pins: 1 IN, 2 Cap+, 3 GND, 4 Cap-, 5 OUT, 6 SHDN, 7 FB, 8 AGND
